# Altium footprint library microbuilder.PCBLIB: 422 footprints (part 18 of 27)
Each footprint in its own frame and in the unit in brackets; x right, y up, seen from the top. Pads: shape width x height; smd on the part's side, far side on the other; paste and mask are expansions set on the pad; w line width, h text height; cw(c..) or ccw(c..) is an arc to the next point about the centre after c.
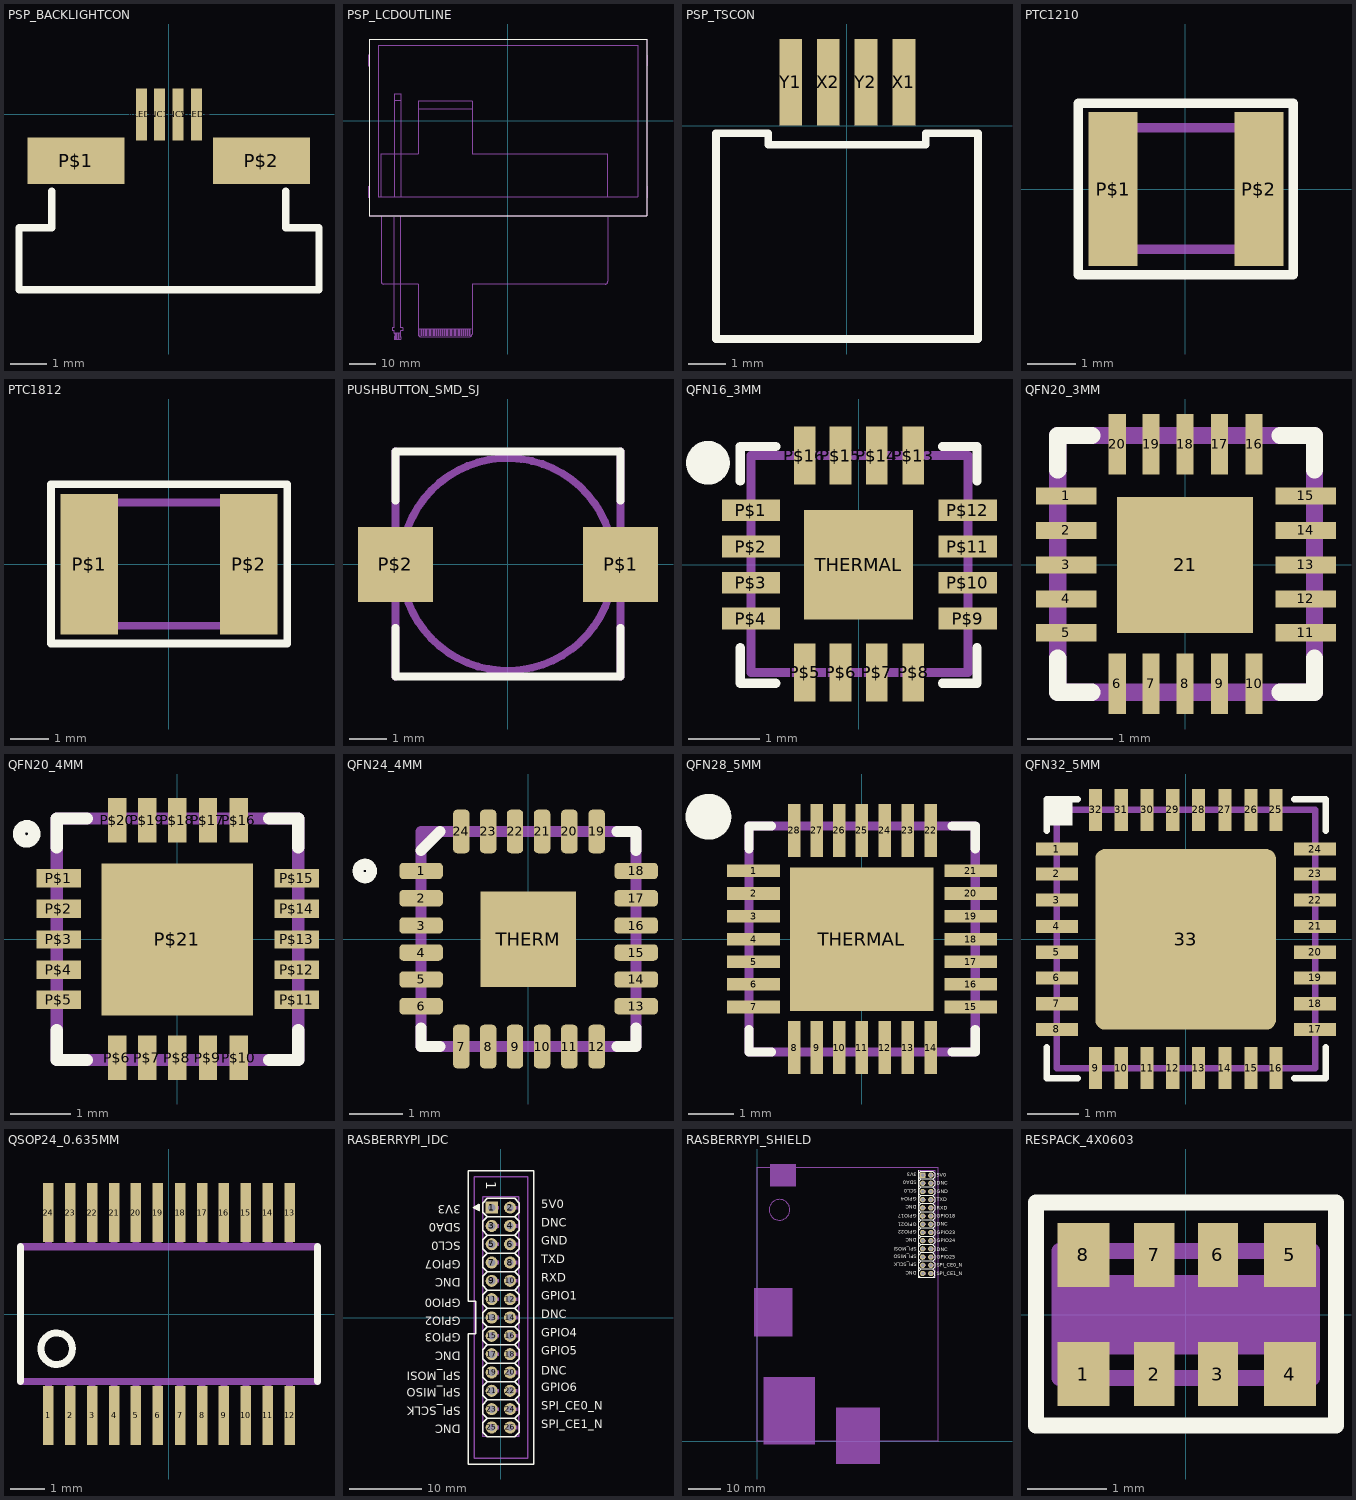
[diagram p17: the footprints below, top view; thin cyan lines are the x and y axes]

## PSP_BACKLIGHTCON [mil]
pads (6):
  rect 12x56 smd: NC1(-9.84,0) NC2(10,0) VLED+(30,0) VLED-(-29.53,0)
  rect 105x50 smd: P$1(-100,-50) P$2(100,-50)
Top Overlay:
  lines w8: -125.98,-82.68 -125.98,-122.05 -161.42,-122.05 -161.42,-188.98 162,-188.98 162,-122.05 126,-122.05 126,-82.68

## PSP_LCDOUTLINE [mil]
Top Overlay:
  lines w8: -2076.77,-1419.29 -2076.77,1227 2077,1227 2077,-1419.29 -2076.77,-1419.29
Mechanical 16:
  drawing of 175 lines, arcs and shapes, not listed
  text "SHARP" at -1692.91,-1338.58 h133.3
  text "LQ043" at 276,-1338.58 h133.3
  text "0.5mm Upper Contacts" at -1280,-3070 h62

## PSP_TSCON [mil]
pads (4):
  rect 24x91 smd: X1(60,46) X2(-19.68,46) Y1(-59.06,46) Y2(20,46)
Top Overlay:
  lines w8: -137.8,-224.41 138,-224.41 138,-7.87 83,-7.87 83,-19.68 -82.68,-19.68 -82.68,-7.87 -137.8,-7.87 -137.8,-224.41

## PTC1210 [mil]
pads (2):
  rect 40x126 smd: P$1(-59.06,0) P$2(60,0)
Top Overlay:
  lines w8: -87.5,-70 88,-70 88,70 -87.5,70 -87.5,-70
Mechanical 16:
  lines w8: -62.99,-49.21 63,-49.21 63,-9.84 cw(c63,0.08) 63,10 63,50 -62.99,50 -62.99,10 cw(c-62.99,0.08) -62.99,-9.84 -62.99,-49.21
Mechanical 27:
  lines w5: -88.58,-68.9 89,-68.9 89,69 -88.58,69 -88.58,-68.9

## PTC1812 [mil]
pads (2):
  rect 60x146 smd: P$1(-82.68,0) P$2(83,0)
Top Overlay:
  lines w8: -122.5,-82.5 123,-82.5 123,83 -122.5,83 -122.5,-82.5
Mechanical 16:
  lines w5: -88.58,-19.69 ccw(c-88.58,0.16) -88.58,20 ; 89,-19.69 cw(c89,0.16) 89,20
  lines w8: -88.58,-19.68 -88.58,-63.98 89,-63.98 89,-19.68 ; -88.58,20 -88.58,64 89,64 89,20
Mechanical 27:
  lines w5: -122.05,-82.68 123,-82.68 123,83 -122.05,83 -122.05,-82.68

## PUSHBUTTON_SMD_SJ [mil]
pads (2):
  rect 79x79 smd: P$1(119,0) P$2(-118.11,0)
Top Overlay:
  lines w8: -118.11,-66.93 -118.11,-118.11 119,-118.11 119,-66.93 ; -118.11,67 -118.11,119 119,119 119,67
Mechanical 16:
  circle w8: c0,0 r112
  lines w5: -118.11,-118.11 119,-118.11 ; -118.1,119 119,119
  lines w8: -118.11,-118.11 -118.1,119 ; 119,-118.11 119,119

## QFN16_3MM [mil]
pads (17):
  rect 32x12 smd: P$1(-59.06,30) P$2(-59.06,10) P$3(-59.06,-9.84) P$4(-59.06,-29.53) P$9(60,-29.53) P$10(60,-9.84) P$11(60,10) P$12(60,30)
  rect 12x32 smd: P$5(-29.53,-59.06) P$6(-9.84,-59.06) P$7(10,-59.06) P$8(30,-59.06) P$13(30,60) P$14(10,60) P$15(-9.84,60) P$16(-29.53,60)
  rect 60x60 smd: THERMAL(0,0)
Top Overlay:
  circle w12: c-82.68,56 r6
  lines w5: -64.96,-45.47 -64.96,-64.96 -45.47,-64.96 ; -64.96,46 -64.96,65 -45.47,65 ; 46,-64.96 65,-64.96 65,-45.47 ; 46,65 65,65 65,46
Mechanical 16:
  lines w5: -59.06,-59.06 60,-59.06 60,60 -59.06,60 -59.06,-59.06

## QFN20_3MM [mil]
pads (21):
  rect 28x8 smd: 1(-55.12,32) 2(-55.12,16) 3(-55.12,0) 4(-55.12,-15.75) 5(-55.12,-31.5) 11(56,-31.5) 12(56,-15.75) 13(56,0) 14(56,16) 15(56,32)
  rect 8x28 smd: 6(-31.5,-55.12) 7(-15.75,-55.12) 8(0,-55.12) 9(16,-55.12) 10(32,-55.12) 16(32,56) 17(16,56) 18(0,56) 19(-15.75,56) 20(-31.5,56)
  rect 63x63 smd: 21(0,0)
Top Overlay:
  lines w8: -59.06,-43.31 -59.06,-59.06 -43.31,-59.06 ; -59.06,44 -59.06,60 -43.31,60 ; 44,-59.06 60,-59.06 60,-43.31 ; 44,60 60,60 60,44
Mechanical 16:
  lines w8: -59.06,-59.06 60,-59.06 60,60 -59.06,60 -59.06,-59.06

## QFN20_4MM [mil]
pads (21):
  rect 29x12 smd: P$1(-77.36,40) P$2(-77.36,20) P$3(-77.36,0) P$4(-77.36,-19.68) P$5(-77.36,-39.37) P$11(78,-39.37) P$12(78,-19.68) P$13(78,0) P$14(78,20) P$15(78,40)
  rect 12x29 smd: P$6(-39.37,-77.36) P$7(-19.68,-77.36) P$8(0,-77.36) P$9(20,-77.36) P$10(40,-77.36) P$16(40,78) P$17(20,78) P$18(0,78) P$19(-19.68,78) P$20(-39.37,78)
  rect 99x99 smd: P$21(0,0)
Top Overlay:
  circle w8: c-98.43,69 r5
  lines w8: -78.74,-59.06 -78.74,-78.74 -59.06,-78.74 ; -78.74,60 -78.74,79 -59.06,79 ; 60,-78.74 79,-78.74 79,-59.06 ; 60,79 79,79 79,60
Top Paste:
  rectangle: -39.37,10 -9.84,40
  rectangle: 10,10 40,40
  rectangle: -39.37,-39.37 -9.84,-9.84
  rectangle: 10,-39.37 40,-9.84
Mechanical 16:
  lines w8: -78.74,-78.74 79,-78.74 79,79 -78.74,79 -78.74,-78.74

## QFN24_4MM [mil]
pads (25):
  rrect50% 32x12 smd: 1(-78.74,50) 2(-78.74,30) 3(-78.74,10) 4(-78.74,-9.84) 5(-78.74,-29.53) 6(-78.74,-49.21) 13(79,-49.21) 14(79,-29.53) 15(79,-9.84) 16(79,10) 17(79,30) 18(79,50)
  rrect50% 12x32 smd: 7(-49.21,-78.74) 8(-29.53,-78.74) 9(-9.84,-78.74) 10(10,-78.74) 11(30,-78.74) 12(50,-78.74) 19(50,79) 20(30,79) 21(10,79) 22(-9.84,79) 23(-29.53,79) 24(-49.21,79)
  rect 70x70 smd: THERM(0,0)
Top Overlay:
  circle w8: c-120,50 r5
  lines w8: -78.74,-64.96 -78.74,-78.74 -64.96,-78.74 ; -78.74,65 -64.96,79 ; 65,-78.74 79,-78.74 79,-64.96 ; 65,79 79,79 79,65
Top Paste:
  rectangle: 4,4 30,30
  rectangle: 4,-29.53 30,-3.94
  rectangle: -29.53,4 -3.94,30
  rectangle: -29.53,-29.53 -3.94,-3.94
Mechanical 16:
  lines w8: -78.74,-78.74 -78.74,79 79,79 79,-78.74 -78.74,-78.74

## QFN28_5MM [mil]
pads (29):
  rect 46x11 smd: 1(-94.49,60) 2(-94.49,40) 3(-94.49,20) 4(-94.49,0) 5(-94.49,-19.68) 6(-94.49,-39.37) 7(-94.49,-59.06) 15(95,-59.06) 16(95,-39.37) 17(95,-19.68) 18(95,0) 19(95,20) 20(95,40) 21(95,60)
  rect 11x46 smd: 8(-59.06,-94.49) 9(-39.37,-94.49) 10(-19.68,-94.49) 11(0,-94.49) 12(20,-94.49) 13(40,-94.49) 14(60,-94.49) 22(60,95) 23(40,95) 24(20,95) 25(0,95) 26(-19.68,95) 27(-39.37,95) 28(-59.06,95)
  rect 125x125 smd: THERMAL(0,0)
Top Overlay:
  circle w20: c-133.86,107 r10
  lines w8: -98.43,-78.74 -98.43,-98.43 -78.74,-98.43 ; -98.43,79 -98.43,99 -78.74,99 ; 79,-98.43 99,-98.43 99,-78.74 ; 79,99 99,99 99,79
Top Paste:
  rectangle: -50,10 -10,50
  rectangle: -50,-50 -10,-10
  rectangle: 10,10 50,50
  rectangle: 10,-50 50,-10
Mechanical 16:
  lines w8: -98.43,-98.43 99,-98.43 99,99 -98.43,99 -98.43,-98.43

## QFN32_5MM [mil]
pads (33):
  rect 32x10 smd: 1(-98.43,69) 2(-98.43,50) 3(-98.43,30) 4(-98.43,10) 5(-98.43,-9.84) 6(-98.43,-29.53) 7(-98.43,-49.21) 8(-98.43,-68.9) 17(99,-68.9) 18(99,-49.21) 19(99,-29.53) 20(99,-9.84) 21(99,10) 22(99,30) 23(99,50) 24(99,69)
  rect 10x32 smd: 9(-68.9,-98.43) 10(-49.21,-98.43) 11(-29.53,-98.43) 12(-9.84,-98.43) 13(10,-98.43) 14(30,-98.43) 15(50,-98.43) 16(69,-98.43) 25(69,99) 26(50,99) 27(30,99) 28(10,99) 29(-9.84,99) 30(-29.53,99) 31(-49.21,99) 32(-68.9,99)
  rrect10% 138x138 smd: 33(0,0)
Top Overlay:
  rectangle: -106.3,87 -86.61,107
  lines w5: -106.3,-82.68 -106.3,-106.3 -82.68,-106.3 ; -106.3,83 -106.3,107 -82.68,107 ; 83,-106.3 107,-106.3 107,-82.68 ; 83,107 107,107 107,83
Top Paste:
  rectangle: -59.06,5 -4.92,60
  rectangle: 5,5 60,60
  rectangle: -59.06,-59.06 -4.92,-4.92
  rectangle: 5,-59.06 60,-4.92
Mechanical 16:
  lines w5: -98.43,-98.43 99,-98.43 99,99 -98.43,99 -98.43,-98.43

## QSOP24_0.635MM [mil]
pads (24):
  rect 12x67 smd: 1(-137.5,-115.55) 2(-112.5,-115.55) 3(-87.5,-115.55) 4(-62.5,-115.55) 5(-37.5,-115.55) 6(-12.5,-115.55) 7(13,-115.55) 8(38,-115.55) 9(63,-115.55) 10(88,-115.55) 11(113,-115.55) 12(138,-115.55) 13(138,116) 14(113,116) 15(88,116) 16(63,116) 17(38,116) 18(13,116) 19(-12.5,116) 20(-37.5,116) 21(-62.5,116) 22(-87.5,116) 23(-112.5,116) 24(-137.5,116)
Top Overlay:
  circle w8: c-127.95,-39.37 r18
  lines w8: -169.29,-76.77 -169.29,77 ; 170,-76.77 170,77
Mechanical 16:
  rectangle: -141.5,-109.77 -133.5,-76.77
  rectangle: 134,77 142,110
  rectangle: -116.5,-109.77 -108.5,-76.77
  rectangle: -91.5,-109.77 -83.5,-76.77
  rectangle: -66.5,-109.77 -58.5,-76.77
  rectangle: -41.5,-109.77 -33.5,-76.77
  rectangle: -16.5,-109.77 -8.5,-76.77
  rectangle: 9,-109.77 17,-76.77
  rectangle: 34,-109.77 42,-76.77
  rectangle: 59,-109.77 67,-76.77
  rectangle: 84,-109.77 92,-76.77
  rectangle: 109,-109.77 117,-76.77
  rectangle: 134,-109.77 142,-76.77
  rectangle: 109,77 117,110
  rectangle: 84,77 92,110
  rectangle: 59,77 67,110
  rectangle: 34,77 42,110
  rectangle: 9,77 17,110
  rectangle: -16.5,77 -8.5,110
  rectangle: -41.5,77 -33.5,110
  rectangle: -66.5,77 -58.5,110
  rectangle: -91.5,77 -83.5,110
  rectangle: -116.5,77 -108.5,110
  rectangle: -141.5,77 -133.5,110
  lines w8: -169.29,-76.77 170,-76.77 170,77 -169.29,77 -169.29,-76.77

## RASBERRYPI_IDC [mil]
pads (26):
  rect 66x66 hole 40: 1(-50,600)
  round 66 hole 40: 2(50,600) 3(-50,500) 4(50,500) 5(-50,400) 6(50,400) 7(-50,300) 8(50,300) 9(-50,200) 10(50,200) 11(-50,100) 12(50,100) 13(-50,0) 14(50,0) 15(-50,-100) 16(50,-100) 17(-50,-200) 18(50,-200) 19(-50,-300) 20(50,-300) 21(-50,-400) 22(50,-400) 23(-50,-500) 24(50,-500) 25(-50,-600) 26(50,-600)
Top Overlay:
  region: -134,610 -134,590 -124,590 -124,610
  region: -124,615 -124,600 -119,600 -119,615
  region: -124,600 -124,585 -119,585 -119,600
  region: -142,605 -142,595 -132,595 -132,605
  lines w8: -140,600 -150,600 ; -150,600 -117,583 -117,617 -150,600 ; -75,-550 -100,-575 -100,-625 -75,-650 75,-650 100,-625 100,-575 75,-550 ; -75,-550 -100,-525 -100,-475 -75,-450 ; -75,-550 75,-550 ; -75,-450 -100,-425 -100,-375 -75,-350 ; -75,-450 75,-450 ; -75,-350 -100,-325 -100,-275 -75,-250 ; -75,-350 75,-350 ; -75,-250 -100,-225 -100,-175 -75,-150 ; -75,-250 75,-250 ; -75,-150 -100,-125 -100,-75 -75,-50 ; -75,-150 75,-150 ; -75,-50 -100,-25 -100,25 -75,50 ; -75,-50 75,-50 ; -75,50 -100,75 -100,125 -75,150 ; -75,50 75,50 ; -75,150 -100,175 -100,225 -75,250 ; -75,150 75,150 ; -75,250 -100,275 -100,325 -75,350 ; -75,250 75,250 ; -75,350 -100,375 -100,425 -75,450 ; -75,350 75,350 ; -75,450 -100,475 -100,525 -75,550 ; -75,450 75,450 ; -75,550 -100,575 -100,625 -75,650 75,650 100,625 100,575 75,550 ; -75,550 75,550 ; 75,-550 100,-525 100,-475 75,-450 ; 75,-450 100,-425 100,-375 75,-350 ; 75,-350 100,-325 100,-275 75,-250 ; 75,-250 100,-225 100,-175 75,-150 ; 75,-150 100,-125 100,-75 75,-50 ; 75,-50 100,-25 100,25 75,50 ; 75,50 100,75 100,125 75,150 ; 75,150 100,175 100,225 75,250 ; 75,250 100,275 100,325 75,350 ; 75,350 100,375 100,425 75,450 ; 75,450 100,475 100,525 75,550 ; -177.17,-799.61 178,-799.61 178,800 -177.17,800 -177.17,89 -137.8,89 -137.8,-88.58 -177.17,-88.58 -177.17,-799.61
  text "5V0" at 220,580 h77.5
  text "DNC" at 220,480 h77.5
  text "GND" at 220,380 h77.5
  text "TXD" at 220,280 h77.5
  text "RXD" at 220,180 h77.5
  text "GPIO1" at 220,80 h77.5
  text "DNC" at 220,-20 h77.5
  text "GPIO4" at 220,-120 h77.5
  text "GPIO5" at 220,-220 h77.5
  text "DNC" at 220,-330 h77.5
  text "GPIO6" at 220,-420 h77.5
  text "SPI_CE0_N" at 220,-520 h77.5
  text "SPI_CE1_N" at 220,-620 h77.5
  text "3V3" at -220,630 h77.5
  text "SDA0" at -220,530 h77.5
  text "SCL0" at -220,430 h77.5
  text "GPIO7" at -220,330 h77.5
  text "DNC" at -220,230 h77.5
  text "GPIO0" at -220,120 h77.5
  text "GPIO2" at -220,20 h77.5
  text "GPIO3" at -220,-70 h77.5
  text "DNC" at -220,-170 h77.5
  text "SPI_MOSI" at -220,-280 h77.5
  text "SPI_MISO" at -220,-370 h77.5
  text "SPI_SCLK" at -220,-470 h77.5
  text "DNC" at -220,-570 h77.5
  text "1" at -100,745 h93
Mechanical 16:
  region: -30,610 -30,590 -10,590 -10,610
  region: 70,610 70,590 90,590 90,610
  region: 70,510 70,490 90,490 90,510
  region: -30,510 -30,490 -10,490 -10,510
  region: 70,410 70,390 90,390 90,410
  region: -30,410 -30,390 -10,390 -10,410
  region: 70,310 70,290 90,290 90,310
  region: 70,210 70,190 90,190 90,210
  region: 70,110 70,90 90,90 90,110
  region: -30,310 -30,290 -10,290 -10,310
  region: -30,210 -30,190 -10,190 -10,210
  region: -30,110 -30,90 -10,90 -10,110
  region: 70,10 70,-10 90,-10 90,10
  region: -30,10 -30,-10 -10,-10 -10,10
  region: 70,-90 70,-110 90,-110 90,-90
  region: -30,-90 -30,-110 -10,-110 -10,-90
  region: 70,-190 70,-210 90,-210 90,-190
  region: -30,-190 -30,-210 -10,-210 -10,-190
  region: 70,-290 70,-310 90,-310 90,-290
  region: -30,-290 -30,-310 -10,-310 -10,-290
  region: 70,-390 70,-410 90,-410 90,-390
  region: -30,-390 -30,-410 -10,-410 -10,-390
  region: 70,-490 70,-510 90,-510 90,-490
  region: -30,-490 -30,-510 -10,-510 -10,-490
  region: 70,-590 70,-610 90,-610 90,-590
  region: -30,-590 -30,-610 -10,-610 -10,-590
  lines w5: -99.92,-650 97,-650
  lines w8: -99.92,-650 -99.92,658 97,658 97,-650 ; -145.67,-768.11 -145.67,769 146,769 146,-768.11 -145.67,-768.11

## RASBERRYPI_SHIELD [mil]
pads (26):
  rect 66x66 hole 40: 1(2020,3250)
  round 66 hole 40: 2(2120,3250) 3(2020,3150) 4(2120,3150) 5(2020,3050) 6(2120,3050) 7(2020,2950) 8(2120,2950) 9(2020,2850) 10(2120,2850) 11(2020,2750) 12(2120,2750) 13(2020,2650) 14(2120,2650) 15(2020,2550) 16(2120,2550) 17(2020,2450) 18(2120,2450) 19(2020,2350) 20(2120,2350) 21(2020,2250) 22(2120,2250) 23(2020,2150) 24(2120,2150) 25(2020,2050) 26(2120,2050)
Top Overlay:
  lines w5: 1971,3308 1971,2000 2167,2000
  lines w6: 1995,2000 1970,2025 1970,2075 1995,2100 1970,2125 1970,2175 1995,2200 1970,2225 1970,2275 1995,2300 1970,2325 1970,2375 1995,2400 1970,2425 1970,2475 1995,2500 1970,2525 1970,2575 1995,2600 1970,2625 1970,2675 1995,2700 1970,2725 1970,2775 1995,2800 1970,2825 1970,2875 1995,2900 1970,2925 1970,2975 1995,3000 1970,3025 1970,3075 1995,3100 1970,3125 1970,3175 1995,3200 1970,3225 1970,3275 1995,3300
  lines w8: 1995,2000 2145,2000 2170,2025 2170,2075 2145,2100 ; 1995,2100 2145,2100 ; 1995,2200 2145,2200 ; 1995,2300 2145,2300 ; 1995,2400 2145,2400 ; 1995,2500 2145,2500 ; 1995,2600 2145,2600 ; 1995,2700 2145,2700 ; 1995,2800 2145,2800 ; 1995,2900 2145,2900 ; 1995,3000 2145,3000 ; 1995,3100 2145,3100 ; 1995,3200 2145,3200 ; 1995,3300 2145,3300 2170,3275 2170,3225 2145,3200 ; 2145,2100 2170,2125 2170,2175 2145,2200 ; 2145,2200 2170,2225 2170,2275 2145,2300 ; 2145,2300 2170,2325 2170,2375 2145,2400 ; 2145,2400 2170,2425 2170,2475 2145,2500 ; 2145,2500 2170,2525 2170,2575 2145,2600 ; 2145,2600 2170,2625 2170,2675 2145,2700 ; 2145,2700 2170,2725 2170,2775 2145,2800 ; 2145,2800 2170,2825 2170,2875 2145,2900 ; 2145,2900 2170,2925 2170,2975 2145,3000 ; 2145,3000 2170,3025 2170,3075 2145,3100 ; 2145,3100 2170,3125 2170,3175 2145,3200
  text "5V0" at 2190,3230 h42.5
  text "DNC" at 2190,3130 h42.5
  text "GND" at 2190,3030 h42.5
  text "TXD" at 2190,2930 h42.5
  text "RXD" at 2190,2830 h42.5
  text "GPIO18" at 2190,2730 h42.5
  text "DNC" at 2190,2630 h42.5
  text "GPIO23" at 2190,2530 h42.5
  text "GPIO24" at 2190,2430 h42.5
  text "DNC" at 2190,2320 h42.5
  text "GPIO25" at 2190,2230 h42.5
  text "SPI_CE0_N" at 2190,2130 h42.5
  text "SPI_CE1_N" at 2190,2030 h42.5
  text "3V3" at 1950,3280 h42.5
  text "SDA0" at 1950,3180 h42.5
  text "SCL0" at 1950,3080 h42.5
  text "GPIO4" at 1950,2980 h42.5
  text "DNC" at 1950,2880 h42.5
  text "GPIO17" at 1950,2770 h42.5
  text "GPIO21" at 1950,2670 h42.5
  text "GPIO22" at 1950,2580 h42.5
  text "DNC" at 1950,2480 h42.5
  text "SPI_MOSI" at 1950,2370 h42.5
  text "SPI_MISO" at 1950,2280 h42.5
  text "SPI_SCLK" at 1950,2180 h42.5
  text "DNC" at 1950,2080 h42.5
Mechanical 1:
  lines w5: 0,0 0,3347 2205,3347 2205,0 0,0
Mechanical 12:
  circle w5: c272,2827 r126
  rectangle: 79,-39.37 709,788
  rectangle: 965,-275.59 1497,414
  rectangle: 158,3111 473,3386
  rectangle: -39.37,1280 434,1871
  region: 0,0 10,0 10,10 0,10
  region: 0,0 10,0 10,10 0,10
Mechanical 16:
  region: 2040,3260 2040,3240 2060,3240 2060,3260
  region: 2140,3260 2140,3240 2160,3240 2160,3260
  region: 2140,3160 2140,3140 2160,3140 2160,3160
  region: 2040,3160 2040,3140 2060,3140 2060,3160
  region: 2140,3060 2140,3040 2160,3040 2160,3060
  region: 2040,3060 2040,3040 2060,3040 2060,3060
  region: 2140,2960 2140,2940 2160,2940 2160,2960
  region: 2140,2860 2140,2840 2160,2840 2160,2860
  region: 2140,2760 2140,2740 2160,2740 2160,2760
  region: 2040,2960 2040,2940 2060,2940 2060,2960
  region: 2040,2860 2040,2840 2060,2840 2060,2860
  region: 2040,2760 2040,2740 2060,2740 2060,2760
  region: 2140,2660 2140,2640 2160,2640 2160,2660
  region: 2040,2660 2040,2640 2060,2640 2060,2660
  region: 2140,2560 2140,2540 2160,2540 2160,2560
  region: 2040,2560 2040,2540 2060,2540 2060,2560
  region: 2140,2460 2140,2440 2160,2440 2160,2460
  region: 2040,2460 2040,2440 2060,2440 2060,2460
  region: 2140,2360 2140,2340 2160,2340 2160,2360
  region: 2040,2360 2040,2340 2060,2340 2060,2360
  region: 2140,2260 2140,2240 2160,2240 2160,2260
  region: 2040,2260 2040,2240 2060,2240 2060,2260
  region: 2140,2160 2140,2140 2160,2140 2160,2160
  region: 2040,2160 2040,2140 2060,2140 2060,2160
  region: 2140,2060 2140,2040 2160,2040 2160,2060
  region: 2040,2060 2040,2040 2060,2040 2060,2060
  lines w8: 1971,3308 2167,3308 2167,2000

## RESPACK_4X0603 [mil]
pads (8):
  rect 26x32 smd: 1(-51.18,-29.53) 4(52,-29.53) 5(52,30) 8(-51.18,30)
  rect 20x32 smd: 2(-15.75,-29.53) 3(16,-29.53) 6(16,30) 7(-15.75,30)
Top Overlay:
  lines w8: -74.8,-55.12 75,-55.12 75,56 -74.8,56 -74.8,-55.12
Mechanical 16:
  rectangle: -61.02,-19.68 62,20
  lines w8: -62.99,-31.5 63,-31.5 63,32 -62.99,32 -62.99,-31.5
Mechanical 27:
  lines w5: -74.8,-55.12 75,-55.12 75,56 -74.8,56 -74.8,-55.12